# Altium footprint library ALL.PcbLib: 385 footprints (part 19 of 25)
Each footprint in its own frame and in the unit in brackets; x right, y up, seen from the top. Pads: shape width x height; smd on the part's side, far side on the other; paste and mask are expansions set on the pad; w line width, h text height; cw(c..) or ccw(c..) is an arc to the next point about the centre after c.
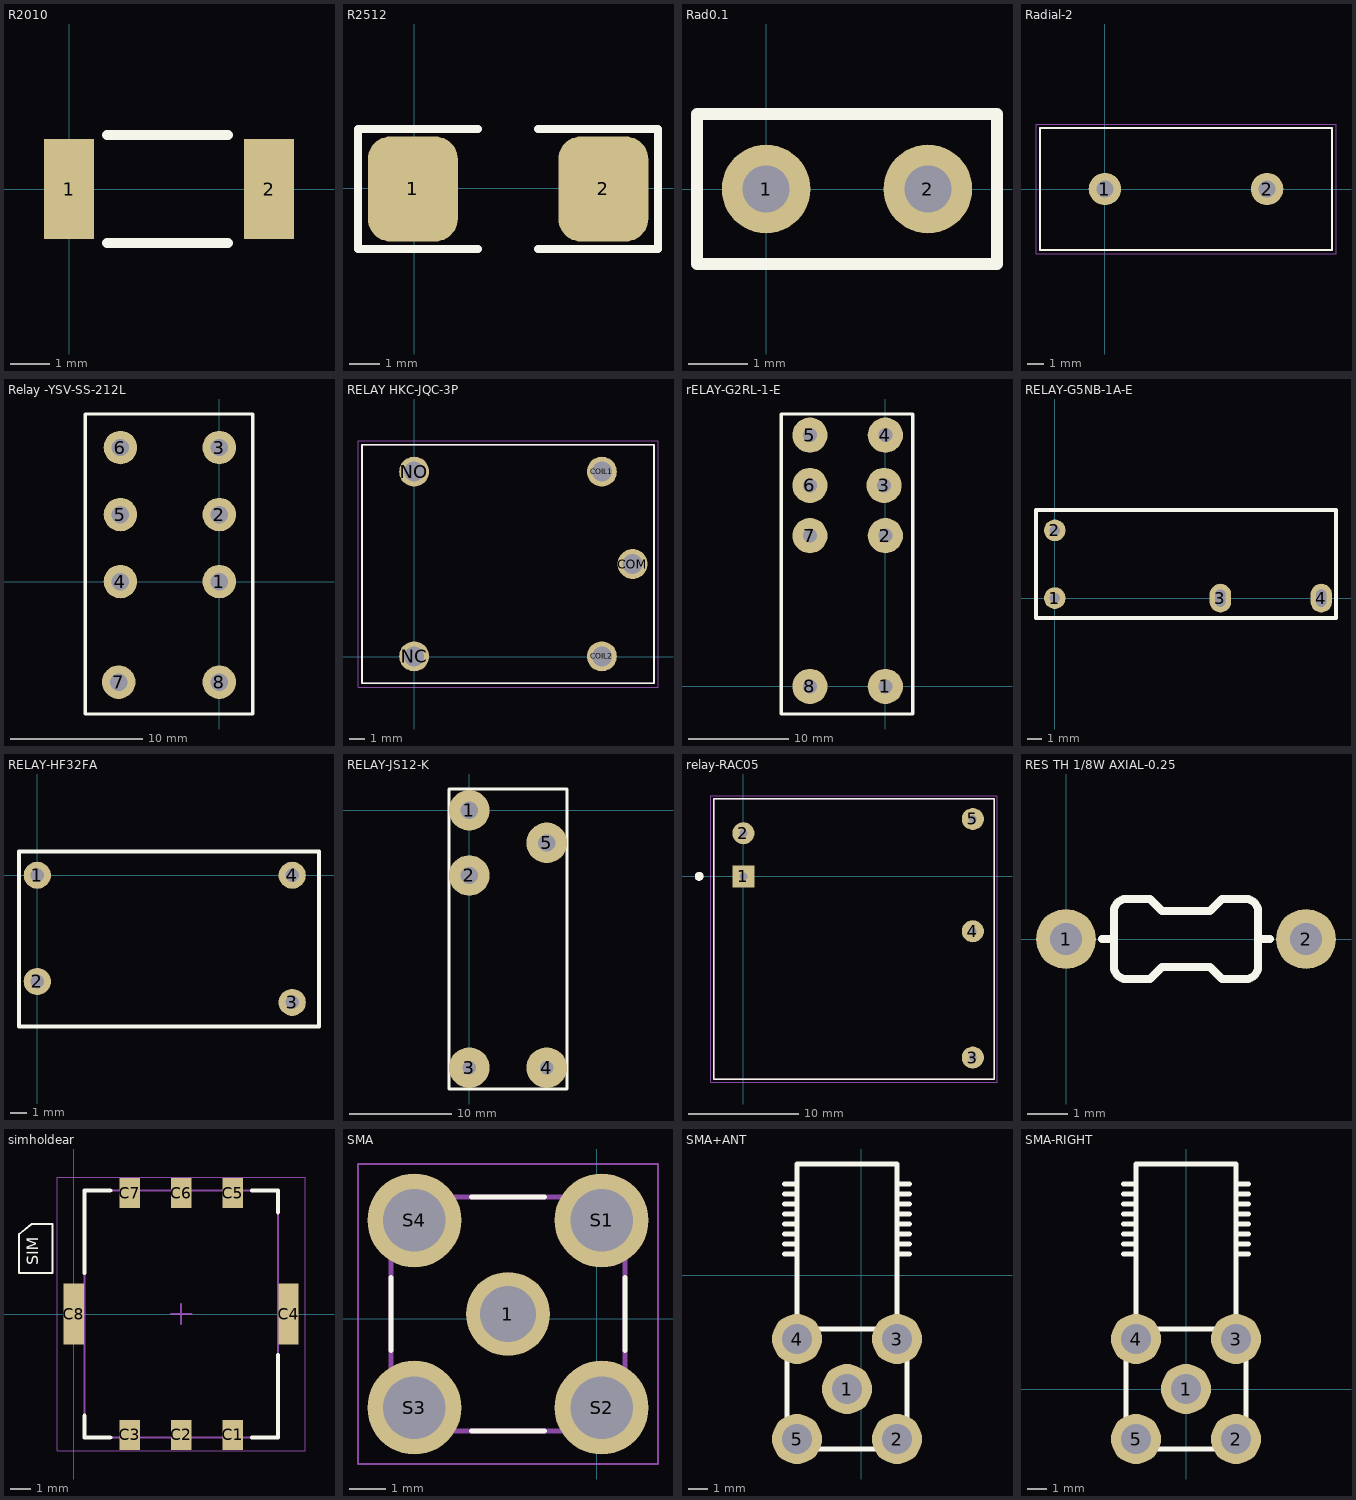
[diagram p18: the footprints below, top view; thin cyan lines are the x and y axes]

## R2010 [mm]
pads (2):
  rect 1.27x2.54 smd: 1(0,0) 2(5.08,0)
Top Overlay:
  lines w0.254: 0.965,-1.372 4.039,-1.372 ; 0.965,1.372 4.039,1.372
3D body "R2010-2.step": height 0.6, standoff 0, extent -0.011,-1.25 4.989,1.25

## R2512 [mm]
pads (2):
  rrect50% 3x3.5 smd: 1(-0.051,-0.025) 2(6.299,-0.025)
Top Overlay:
  lines w0.254: 2.124,-2.025 -1.876,-2.025 -1.876,1.975 2.124,1.975 ; 4.124,-2.025 8.124,-2.025 8.124,1.975 4.124,1.975
3D body "User Library-2512 SMD Resistor.step": height 1.6, standoff 0, extent -0.051,-1.525 6.299,1.475

## Rad0.1 [mm]
pads (2):
  round 1.5 hole 0.8: 1(0,0) 2(2.74,0)
Top Overlay:
  lines w0.2: -1.17,-1.27 3.91,-1.27 3.91,1.27 -1.17,1.27 -1.17,-1.27
3D body "SW3dPS-Cap 100n.STEP": height 5.92, standoff -2, extent -1.448,-0.823 4.394,0.874

## Radial-2 [mm]
pads (2):
  round 2 hole 1.05: 1(0,0) 2(10,0)
Top Overlay:
  lines w0.127: -4,-3.75 -4,3.75 14,3.75 14,-3.75 -4,-3.75
Mechanical 13:
  lines w0.127: -4,-3.75 14,-3.75 14,3.75 -4,3.75 -4,-3.75
Mechanical 15:
  lines w0.05: -4.25,-4 14.25,-4 14.25,4 -4.25,4 -4.25,-4

## Relay -YSV-SS-212L [mil]
pads (8):
  round 100 hole 52: 1(0,0) 2(0,200) 3(0,400) 4(-295,0) 5(-295,200) 6(-295,400) 7(-300,-300) 8(0,-300)
Top Overlay:
  lines w10: -400,-395 -400,500 -375,500 100,500 100,-395 -400,-395
3D body: height 433.07, standoff 0, extent -375,-375 75,475

## RELAY HKC-JQC-3P [mm]
pads (5):
  round 1.95 hole 1.3: COIL1(12.2,12.025) COIL2(12.2,0.025) COM(14.2,6.025) NC(0,0.025) NO(0,12.025)
Top Overlay:
  lines w0.127: -3.4,-1.725 -3.4,13.775 15.6,13.775 15.6,-1.725 -3.4,-1.725
Mechanical 13:
  lines w0.127: -3.4,-1.725 -3.4,13.775 15.6,13.775 15.6,-1.725 -3.4,-1.725
Mechanical 15:
  lines w0.05: -3.65,-1.975 -3.65,14.025 15.85,14.025 15.85,-1.975 -3.65,-1.975
3D body "JQC-3F-1C-24VDC--3DModel-STEP-56544.STEP": height 15.5, standoff -4.5, extent -3.302,-1.882 15.698,13.618

## rELAY-G2RL-1-E [mm]
pads (8):
  round 3.5 hole 1.4: 1(0,0) 2(0,15) 3(-0.127,20) 4(0,25) 5(-7.5,25) 6(-7.5,20) 7(-7.5,15) 8(-7.5,0)
Top Overlay:
  lines w0.305: -10.354,-2.74 2.727,-2.74 2.727,27.105 -10.354,27.105 -10.354,-2.74
3D body "g2rl-1-e_24dc.stp": height 15.7, standoff -3.5, extent -10.1,-2.381 2.6,26.619

## RELAY-G5NB-1A-E [mm]
pads (4):
  round 1.5 hole 0.7: 1(0,0) 2(0,4.7)
  oval 1.5x2 hole 0.7 slot 1.2 at 90 deg: 3(11.5,0) 4(18.5,0)
Top Overlay:
  lines w0.254: -1.304,-1.379 -1.304,6.114 19.524,6.114 19.524,-1.379 -1.304,-1.379
3D body "RELAY-G5NB-1A-E.step": height 15.66, standoff -3.05, extent -1.131,-1.231 19.369,5.969

## RELAY-HF32FA [mil]
pads (4):
  round 64 hole 32: 1(0,0) 2(0,-250) 3(600,-299.21) 4(600,0)
Top Overlay:
  lines w10: -43,-356 -43,56 663,56 663,-356 -43,-356
3D body "hf32fa.stp": height 503.94, standoff -137.8, extent -36.77,-348.82 656.14,48.82

## RELAY-JS12-K [mm]
pads (5):
  round 4 hole 1.7: 1(0,0) 2(0,-6.4) 5(7.62,-3.2)
  round 4 hole 1.3: 3(0,-25.3) 4(7.62,-25.3)
Top Overlay:
  lines w0.305: -2,-27.4 -2,2.1 9.62,2.1 9.62,-27.4 -2,-27.4
3D body: height 12.7, standoff 0, extent -1.778,-27.178 9.398,1.905

## relay-RAC05 [mm]
pads (5):
  rect 2x2 hole 0.71: 1(0,0)
  round 2 hole 0.71: 2(0,3.9) 3(20.76,-16.4) 4(20.76,-4.97) 5(20.76,5.19)
Top Overlay:
  circle w0.4: c-4,0 r0.2
  lines w0.127: -2.7,-18.37 -2.7,7.03 22.7,7.03 22.7,-18.37 -2.7,-18.37
Mechanical 13:
  circle w0.4: c-4,0 r0.2
  lines w0.127: -2.7,-18.37 -2.7,7.03 22.7,7.03 22.7,-18.37 -2.7,-18.37
Mechanical 15:
  lines w0.05: -2.95,-18.62 -2.95,7.28 22.95,7.28 22.95,-18.62 -2.95,-18.62
3D body "RAC05-05SK--3DModel-STEP-1.STEP": height 16.6, standoff -5.03, extent -2.818,-18.488 22.782,7.112

## RES TH 1/8W AXIAL-0.25 [mm]
pads (2):
  round 1.5 hole 0.8: 1(0,0) 2(6,0)
Top Overlay:
  lines w0.2: 0.9,0 1.2,0 ; 4.8,0 5.1,0 ; 1.2,-0.7 ccw(c1.5,-0.7) 1.5,-1 2.1,-1 2.4,-0.7 3.6,-0.7 3.9,-1 4.5,-1 ccw(c4.5,-0.7) 4.8,-0.7 4.8,0.7 ccw(c4.5,0.7) 4.5,1 3.9,1 3.6,0.7 2.4,0.7 2.1,1 1.5,1 ccw(c1.5,0.7) 1.2,0.7 1.2,-0.7
3D body "User Library-Res_1-8w_1_0.step": height 1.9, standoff -2, extent -0.2,-0.9 6.2,0.9

## simholdear [mm]
pads (8):
  rect 1x1.5 smd: C1(7.84,-5.969) C2(5.3,-5.969) C3(2.76,-5.969) C5(7.84,5.969) C6(5.3,5.969) C7(2.76,5.969)
  rect 1x3 smd: C4(10.6,0) C8(0,0)
Top Overlay:
  lines w0.1: -2.701,2.032 -2.701,3.937 -2.066,4.445 -1.05,4.445 -1.05,2.032 -1.431,2.032 -2.701,2.032
  lines w0.2: 0.53,-5.02 0.53,-6.1 1.8,-6.1 ; 0.53,2.02 0.53,6.1 1.8,6.1 ; 8.8,-6.1 10.07,-6.1 10.07,-2.02 ; 8.8,6.1 10.07,6.1 10.07,5.02
  text "SIM" at -1.558,2.413 h1
Mechanical 13:
  lines w0.05: -0.825,6.75 11.425,6.75
  lines w0.1: 0.53,-6.1 0.53,6.1 10.07,6.1 10.07,-6.1 0.53,-6.1
Mechanical 15:
  lines w0.05: -0.825,6.75 -0.825,-6.75 11.425,-6.75 11.425,6.75
  lines w0.1: 4.8,0 5.8,0 ; 5.3,-0.5 5.3,0.5
3D body "User Library-Sim Card Holder.STEP": height 1.8, standoff 0, extent -1.52,-6.626 14.88,9.674

## SMA [mm]
pads (5):
  round 2.28 hole 1.52: 1(-2.413,0.127)
  round 2.55 hole 1.7: S1(0.127,2.667) S2(0.127,-2.413) S3(-4.953,-2.413) S4(-4.953,2.667)
Top Overlay:
  lines w0.127: -5.588,-0.873 -5.588,1.127 ; -3.413,-3.048 -1.413,-3.048 ; -3.413,3.302 -1.413,3.302 ; 0.762,-0.873 0.762,1.127
Mechanical 13:
  lines w0.127: -5.588,-3.048 -5.588,3.302 0.762,3.302 0.762,-3.048 -5.588,-3.048
Mechanical 15:
  lines w0.05: -6.483,-3.943 -6.483,4.197 1.657,4.197 1.657,-3.943 -6.483,-3.943
3D body "CONSMA001--3DModel-STEP-1 (2).STEP": height 9.78, standoff -3.81, extent -5.918,-3.378 1.092,3.632

## SMA+ANT [mm]
pads (5):
  round 2.54 hole 1.5: 1(-0.729,-5.788) 2(1.811,-8.328) 3(1.811,-3.248) 4(-3.269,-3.248) 5(-3.269,-8.328)
Top Overlay:
  lines w0.254: -3.904,1.07 -3.269,1.07 ; -3.904,1.578 -3.269,1.578 ; -3.904,2.086 -3.396,2.086 ; -3.904,2.594 -3.269,2.594 ; -3.904,3.102 -3.269,3.102 ; -3.904,3.61 -3.269,3.61 ; -3.904,4.118 -3.269,4.118 ; -3.904,4.626 -3.269,4.626 ; -3.269,-2.74 -3.269,5.642 1.811,5.642 1.811,-2.74 ; 1.811,1.07 2.446,1.07 ; 1.811,1.578 2.446,1.578 ; 1.811,2.594 2.446,2.594 ; 1.811,3.102 2.446,3.102 ; 1.811,3.61 2.446,3.61 ; 1.811,4.118 2.446,4.118 ; 1.811,4.626 2.446,4.626 ; 1.938,2.086 2.446,2.086 ; -3.777,-8.836 -3.777,-2.74 2.319,-2.74 2.319,-8.836 -3.777,-8.836
3D body "5-1814400-1.stp": height 9.18, standoff -4.35, extent -3.683,-8.878 2.644,5.322
3D body: height 52.75, standoff 1.39, extent -5.936,1.222 4.564,20.222

## SMA-RIGHT [mm]
pads (5):
  round 2.54 hole 1.5: 1(0,0) 2(2.54,-2.54) 3(2.54,2.54) 4(-2.54,2.54) 5(-2.54,-2.54)
Top Overlay:
  lines w0.254: -3.175,6.858 -2.54,6.858 ; -3.175,7.366 -2.54,7.366 ; -3.175,7.874 -2.667,7.874 ; -3.175,8.382 -2.54,8.382 ; -3.175,8.89 -2.54,8.89 ; -3.175,9.398 -2.54,9.398 ; -3.175,9.906 -2.54,9.906 ; -3.175,10.414 -2.54,10.414 ; -2.54,3.048 -2.54,11.43 2.54,11.43 2.54,3.048 ; 2.54,6.858 3.175,6.858 ; 2.54,7.366 3.175,7.366 ; 2.54,8.382 3.175,8.382 ; 2.54,8.89 3.175,8.89 ; 2.54,9.398 3.175,9.398 ; 2.54,9.906 3.175,9.906 ; 2.54,10.414 3.175,10.414 ; 2.667,7.874 3.175,7.874 ; -3.048,-3.048 3.048,-3.048 3.048,3.048 -3.048,3.048 -3.048,-3.048
3D body "5-1814400-1.stp": height 10.18, standoff -3.35, extent -3.152,-3.036 3.175,11.164